# Altium footprint library User.PcbLib: 317 footprints (part 2 of 20)
Each footprint in its own frame and in the unit in brackets; x right, y up, seen from the top. Pads: shape width x height; smd on the part's side, far side on the other; paste and mask are expansions set on the pad; w line width, h text height; cw(c..) or ccw(c..) is an arc to the next point about the centre after c.
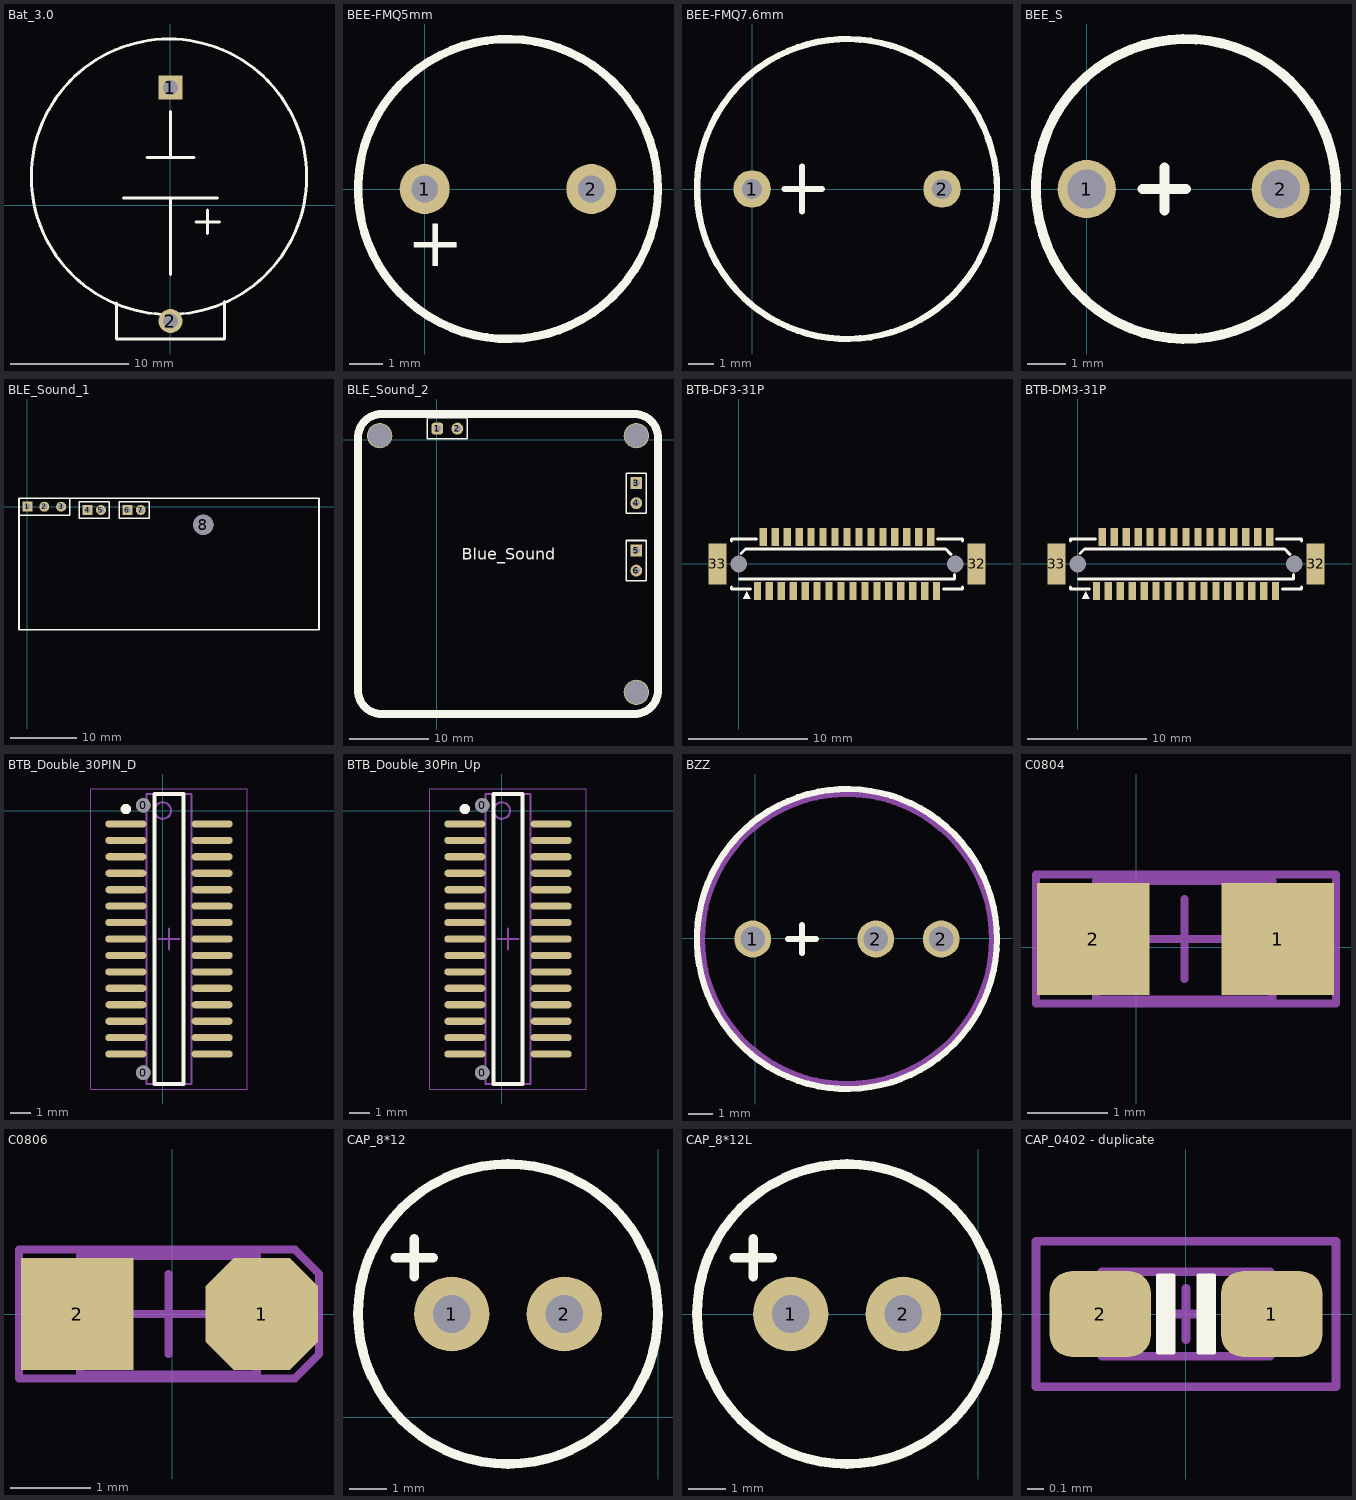
[diagram p1: the footprints below, top view; thin cyan lines are the x and y axes]

## Bat_3.0 [mil]
pads (2):
  rect 80x80 hole 50: 1(0,393.7)
  round 80 hole 50: 2(0,-386.3)
Top Overlay:
  circle w10: c-5,95.7 r460
  lines w10: -180,-326.3 -180,-446.3 180,-446.3 180,-320.3 ; -157,24.7 157,24.7 ; -78,160.62 78,160.62 ; 0,-231.3 0,24.7 ; 0,162.01 0,313.7 ; 85.22,-55.06 164.22,-55.06 ; 124.22,-94.06 124.22,-15.06
3D body "bat_n.stp": height 301.57, standoff -181.11, extent -435.9,-432.27 435.48,519.22

## BEE-FMQ5mm [mm]
pads (2):
  round 1.5 hole 0.8: 1(0,0) 2(5,0)
Top Overlay:
  circle w0.254: c2.5,0 r4.5
  text "+" at -0.533,-2.311 h1.5
3D body "cst-951ap.stp": height 4.5, standoff -4.5, extent -2,-4.5 7,4.5

## BEE-FMQ7.6mm [mm]
pads (2):
  round 1.5 hole 0.8: 1(0,0) 2(7.6,0)
Top Overlay:
  circle w0.254: c3.799,0 r6.001
  lines w0.254: 1.3,0 2.8,0 ; 2,-0.9 2,0.9
3D body "User Library-WST-1203UX.STEP": height 9.65, standoff -4.5, extent -5.727,-6 9.727,6

## BEE_S [mm]
pads (2):
  round 1.5 hole 1: 1(0,0) 2(5,0)
Top Overlay:
  circle w0.254: c2.56,0 r3.868
  lines w0.254: 1.442,0 2.56,0 ; 2.001,-0.559 2.001,0.559
3D body "MIC6X5.5mm.stp": height 5.02, standoff -3, extent -0.567,-2.992 5.433,2.992

## BLE_Sound_1 [mm]
pads (8):
  rect 1.5x1.5 hole 0.9: 1(0,0) 4(9.08,-0.5) 6(15.08,-0.5)
  round 1.5 hole 0.9: 2(2.54,0) 3(5.08,0) 5(11.08,-0.5) 7(17.08,-0.5)
  round 3 hole 3.1: 8(26.53,-2.73)
Top Overlay:
  lines w0.2: -1.27,-1.27 6.35,-1.27 6.35,1.27 ; 7.81,-1.77 12.32,-1.77 12.32,0.77 7.81,0.77 7.81,-1.77 ; 13.81,-1.77 13.81,0.77 18.38,0.77 18.38,-1.77 13.81,-1.77
  lines w0.254: -1.27,-18.542 -1.27,1.27 43.942,1.27 43.942,-18.542 -1.27,-18.542
3D body: height 12, standoff 11, extent -1.295,-18.542 43.967,1.245

## BLE_Sound_2 [mm]
pads (9):
  rrect50% 1.5x1.5 hole 0.9: 1(0.097,1.4)
  round 1.5 hole 0.9: 2(2.637,1.4) 4(25.3,-8.04) 6(25.3,-16.58)
  rect 1.5x1.5 hole 0.9: 3(25.3,-5.5) 5(25.3,-14.04)
  round 3.2 hole 3: ""(-7.2,0.5) ""(25.3,-32) ""(25.3,0.5)
Top Overlay:
  lines w0.2: -1.173,2.67 -1.173,0.13 3.907,0.13 3.907,2.67 ; -1.17,2.77 3.91,2.77 ; 24.03,-17.85 24.03,-12.77 26.57,-12.77 26.57,-17.85 24.03,-17.85 ; 24.03,-9.31 24.03,-4.23 26.57,-4.23 26.57,-9.31 24.03,-9.31
  lines w1: -9.95,-31.75 ccw(c-6.95,-31.75) -6.95,-34.75 25.05,-34.75 ccw(c25.05,-31.75) 28.05,-31.75 28.05,0.25 ccw(c25.05,0.25) 25.05,3.25 -6.95,3.25 ccw(c-6.95,0.25) -9.95,0.25 -9.95,-31.75
  text "Blue_Sound" at 3.2,-15.7 h2.54
3D body: height 15, standoff 11, extent -9.5,-34.4 27.7,2.8

## BTB-DF3-31P [mm] "1MM"
pads (35):
  rect 0.6x1.5 smd: 1(1.55,-2.25) 2(2.05,2.25) 3(2.55,-2.25) 4(3.05,2.25) 5(3.55,-2.25) 6(4.05,2.25) 7(4.55,-2.25) 8(5.05,2.25) 9(5.55,-2.25) 10(6.05,2.25) 11(6.55,-2.25) 12(7.05,2.25) 13(7.55,-2.25) 14(8.05,2.25) 15(8.55,-2.25) 16(9.05,2.25) 17(9.55,-2.25) 18(10.05,2.25) 19(10.55,-2.25) 20(11.05,2.25) 21(11.55,-2.25) 22(12.05,2.25) 23(12.55,-2.25) 24(13.05,2.25) 25(13.55,-2.25) 26(14.05,2.25) 27(14.55,-2.25) 28(15.05,2.25) 29(15.55,-2.25) 30(16.05,2.25) 31(16.55,-2.25)
  rect 1.5x3.4 smd: 32(19.9,0) 33(-1.8,0)
  round 1.219 hole 1.4 unplated: ""(0,0) ""(18.1,0)
Top Overlay:
  region: 0.35,-2.9 0.95,-2.9 0.65,-2.3
  lines w0.254: -0.6,-1.926 -0.6,-2.1 0.969,-2.1 ; -0.6,1.926 -0.6,2.1 1.469,2.1 ; 0.05,-1.25 18.05,-1.25 18.05,-0.892 ; 0.175,0.875 0.55,1.25 17.3,1.25 17.735,0.815 ; 16.631,2.1 18.7,2.1 18.7,1.926 ; 17.131,-2.1 18.7,-2.1 18.7,-1.926
Mechanical 15:
  region: 0.35,-2.9 0.95,-2.9 0.65,-2.3
3D body "3D_PCB2_2022-03-05.step": height 3.35, standoff 0.05, extent -1.524,-2.8 19.576,2.8

## BTB-DM3-31P [mm]
pads (35):
  rect 0.6x1.5 smd: 1(1.55,-2.25) 2(2.05,2.25) 3(2.55,-2.25) 4(3.05,2.25) 5(3.55,-2.25) 6(4.05,2.25) 7(4.55,-2.25) 8(5.05,2.25) 9(5.55,-2.25) 10(6.05,2.25) 11(6.55,-2.25) 12(7.05,2.25) 13(7.55,-2.25) 14(8.05,2.25) 15(8.55,-2.25) 16(9.05,2.25) 17(9.55,-2.25) 18(10.05,2.25) 19(10.55,-2.25) 20(11.05,2.25) 21(11.55,-2.25) 22(12.05,2.25) 23(12.55,-2.25) 24(13.05,2.25) 25(13.55,-2.25) 26(14.05,2.25) 27(14.55,-2.25) 28(15.05,2.25) 29(15.55,-2.25) 30(16.05,2.25) 31(16.55,-2.25)
  rect 1.5x3.4 smd: 32(19.9,0) 33(-1.8,0)
  round 1.219 hole 1.4 unplated: ""(0,0) ""(18.1,0)
Top Overlay:
  region: 0.35,-2.9 0.95,-2.9 0.65,-2.3
  lines w0.254: -0.6,-1.926 -0.6,-2.1 0.969,-2.1 ; -0.6,1.926 -0.6,2.1 1.469,2.1 ; 0.05,-1.25 18.05,-1.25 18.05,-0.892 ; 0.175,0.875 0.55,1.25 17.3,1.25 17.735,0.815 ; 16.631,2.1 18.7,2.1 18.7,1.926 ; 17.131,-2.1 18.7,-2.1 18.7,-1.926
Mechanical 15:
  region: 0.35,-2.9 0.95,-2.9 0.65,-2.3
3D body "3D_PCB2_2022-03-06.step": height 3.35, standoff -0.95, extent -1.508,-2.806 19.592,2.794

## BTB_Double_30PIN_D [mm] "0.8MM"
pads (32):
  round 0.7 hole 0.7: 0(-0.95,-12.75) 0(-0.95,0.25)
  oval 2x0.35 smd: 1(-1.8,-0.65) 2(-1.8,-1.45) 3(-1.8,-2.25) 4(-1.8,-3.05) 5(-1.8,-3.85) 6(-1.8,-4.65) 7(-1.8,-5.45) 8(-1.8,-6.25) 9(-1.8,-7.05) 10(-1.8,-7.85) 11(-1.8,-8.65) 12(-1.8,-9.45) 13(-1.8,-10.25) 14(-1.8,-11.05) 15(-1.8,-11.85) 16(2.4,-11.85) 17(2.4,-11.05) 18(2.4,-10.25) 19(2.4,-9.45) 20(2.4,-8.65) 21(2.4,-7.85) 22(2.4,-7.05) 23(2.4,-6.25) 24(2.4,-5.45) 25(2.4,-4.65) 26(2.4,-3.85) 27(2.4,-3.05) 28(2.4,-2.25) 29(2.4,-1.45) 30(2.4,-0.65)
Top Overlay:
  circle w0.25: c-1.8,0.075 r0.125
  lines w0.2: -0.4,-13.3 -0.4,0.8 1,0.8 1,-13.3 -0.4,-13.3
Mechanical 13:
  circle w0.1: c0,0 r0.4
  lines w0.1: -0.8,-13.3 -0.8,0.8 1.4,0.8 1.4,-13.3 -0.8,-13.3
Mechanical 15:
  lines w0.05: -3.5,-13.55 -3.5,1.05 4.1,1.05 4.1,-13.55 -3.5,-13.55
  lines w0.1: -0.2,-6.25 0.8,-6.25 ; 0.3,-6.75 0.3,-5.75
3D body "SG340-GxxS-B1-2x15.STEP": height 4, standoff -0.6, extent -2.2,-13.2 2.8,0.7

## BTB_Double_30Pin_Up [mm] "0.8mm"
pads (32):
  round 0.7 hole 0.7: 0(-0.95,-12.75) 0(-0.95,0.25)
  oval 2x0.35 smd: 1(-1.8,-0.65) 2(-1.8,-1.45) 3(-1.8,-2.25) 4(-1.8,-3.05) 5(-1.8,-3.85) 6(-1.8,-4.65) 7(-1.8,-5.45) 8(-1.8,-6.25) 9(-1.8,-7.05) 10(-1.8,-7.85) 11(-1.8,-8.65) 12(-1.8,-9.45) 13(-1.8,-10.25) 14(-1.8,-11.05) 15(-1.8,-11.85) 16(2.4,-11.85) 17(2.4,-11.05) 18(2.4,-10.25) 19(2.4,-9.45) 20(2.4,-8.65) 21(2.4,-7.85) 22(2.4,-7.05) 23(2.4,-6.25) 24(2.4,-5.45) 25(2.4,-4.65) 26(2.4,-3.85) 27(2.4,-3.05) 28(2.4,-2.25) 29(2.4,-1.45) 30(2.4,-0.65)
Top Overlay:
  circle w0.25: c-1.8,0.075 r0.125
  lines w0.2: -0.4,-13.3 -0.4,0.8 1,0.8 1,-13.3 -0.4,-13.3
Mechanical 13:
  circle w0.1: c0,0 r0.4
  lines w0.1: -0.8,-13.3 -0.8,0.8 1.4,0.8 1.4,-13.3 -0.8,-13.3
Mechanical 15:
  lines w0.05: -3.5,-13.55 -3.5,1.05 4.1,1.05 4.1,-13.55 -3.5,-13.55
  lines w0.1: -0.2,-6.25 0.8,-6.25 ; 0.3,-6.75 0.3,-5.75
3D body "SG340-GxxP-B1-2x15.STEP": height 5.9, standoff -0.6, extent -2.18,-13.2 2.78,0.7

## BZZ [mm]
pads (3):
  round 1.5 hole 1: 1(-0.102,-0.025) 2(4.898,-0.025) 2(7.558,-0.025)
Top Overlay:
  circle w0.254: c3.728,-0.025 r6.096
  lines w0.254: 1.341,-0.025 2.458,-0.025 ; 1.9,-0.584 1.9,0.533
Mechanical 13:
  circle w0.254: c3.728,-0.025 r5.9
3D body: height 9.7, standoff 9.25, extent -4.171,-2.025 -0.171,1.975
3D body: height 9.5, standoff 0, extent -2.171,-5.925 9.629,5.875
3D body: height 9.75, standoff 9.25, extent -2.271,-6.025 9.729,5.975

## C0804 [mm]
pads (2):
  rect 1.4x1.4 smd: 1(1.767,0.102) 2(-0.533,0.102)
Mechanical 13:
  lines w0.1: -0.498,-0.652 1.702,-0.652 1.702,0.827 -0.498,0.827 -0.498,-0.652
Mechanical 15:
  lines w0.1: 0.102,0.102 1.102,0.102 ; 0.602,-0.398 0.602,0.602 ; -1.245,-0.698 2.489,-0.698 2.489,0.902 -1.245,0.902 -1.245,-0.698
3D body "RESC2012(0805).STEP": height 0.5, standoff 0, extent -0.398,-0.498 1.602,0.702

## C0806 [mm]
pads (2):
  oct 1.4x1.4 smd: 1(1.114,0)
  rect 1.4x1.4 smd: 2(-1.186,0)
Mechanical 13:
  lines w0.1: -1.151,-0.754 -1.151,0.725 1.049,0.725 1.049,-0.754 -1.151,-0.754
Mechanical 15:
  lines w0.1: -0.551,0 0.449,0 ; -0.051,-0.5 -0.051,0.5 ; -1.91,-0.8 -1.91,0.8 1.524,0.8 1.824,0.5 1.824,-0.5 1.524,-0.8 -1.91,-0.8
3D body "LED0805(R).STEP": height 1.1, standoff 0, extent -1.061,-0.625 0.959,0.625

## CAP_8*12 [mm]
pads (2):
  round 2 hole 1: 1(-5.5,2.75) 2(-2.5,2.75)
Top Overlay:
  circle w0.254: c-4,2.75 r4
  lines w0.254: -7,4.25 -6,4.25 ; -6.5,3.75 -6.5,4.75
3D body: height 12, standoff 0, extent -8,-1.247 0,6.747

## CAP_8*12L [mm]
pads (2):
  round 2 hole 1: 1(-5,0) 2(-2,0)
Top Overlay:
  circle w0.254: c-3.5,0 r4
  lines w0.254: -6.5,1.5 -5.5,1.5 ; -6,1 -6,2
3D body: height 8, standoff 0, extent -7.5,0 0.5,12
3D body: height 4, standoff 0, extent -2.496,-0.499 -1.5,0.499
3D body: height 4, standoff 0, extent -5.496,-0.499 -4.5,0.499

## CAP_0402 - duplicate [mm]
pads (2):
  rrect50% 0.6x0.508 smd: 1(0.508,0) 2(-0.508,0)
Top Overlay:
  region: 0.165,-0.229 0.076,-0.229 0.076,0.229 0.165,0.229
  region: -0.165,0.229 -0.076,0.229 -0.076,-0.229 -0.165,-0.229
  lines w0.025: -0.165,-0.229 -0.165,0.229 -0.076,0.229 -0.076,-0.229 -0.165,-0.229 ; 0.076,-0.229 0.165,-0.229 0.165,0.229 0.076,0.229 0.076,-0.229
Mechanical 13:
  lines w0.051: -0.152,0 0.152,0 ; 0,-0.152 0,0.152 ; -0.5,-0.25 -0.5,0.25 0.5,0.25 0.5,-0.25 -0.5,-0.25
Mechanical 14:
  lines w0.051: -0.889,-0.432 0.889,-0.432 0.889,0.432 -0.889,0.432 -0.889,-0.432
3D body "CAPC1005X05L.step": height 0.5, standoff 0, extent -0.5,-0.25 0.5,0.25